# Altium footprint library Pcb-hionyPcbLib.PcbLib: 580 footprints (part 14 of 37)
Each footprint in its own frame and in the unit in brackets; x right, y up, seen from the top. Pads: shape width x height; smd on the part's side, far side on the other; paste and mask are expansions set on the pad; w line width, h text height; cw(c..) or ccw(c..) is an arc to the next point about the centre after c.
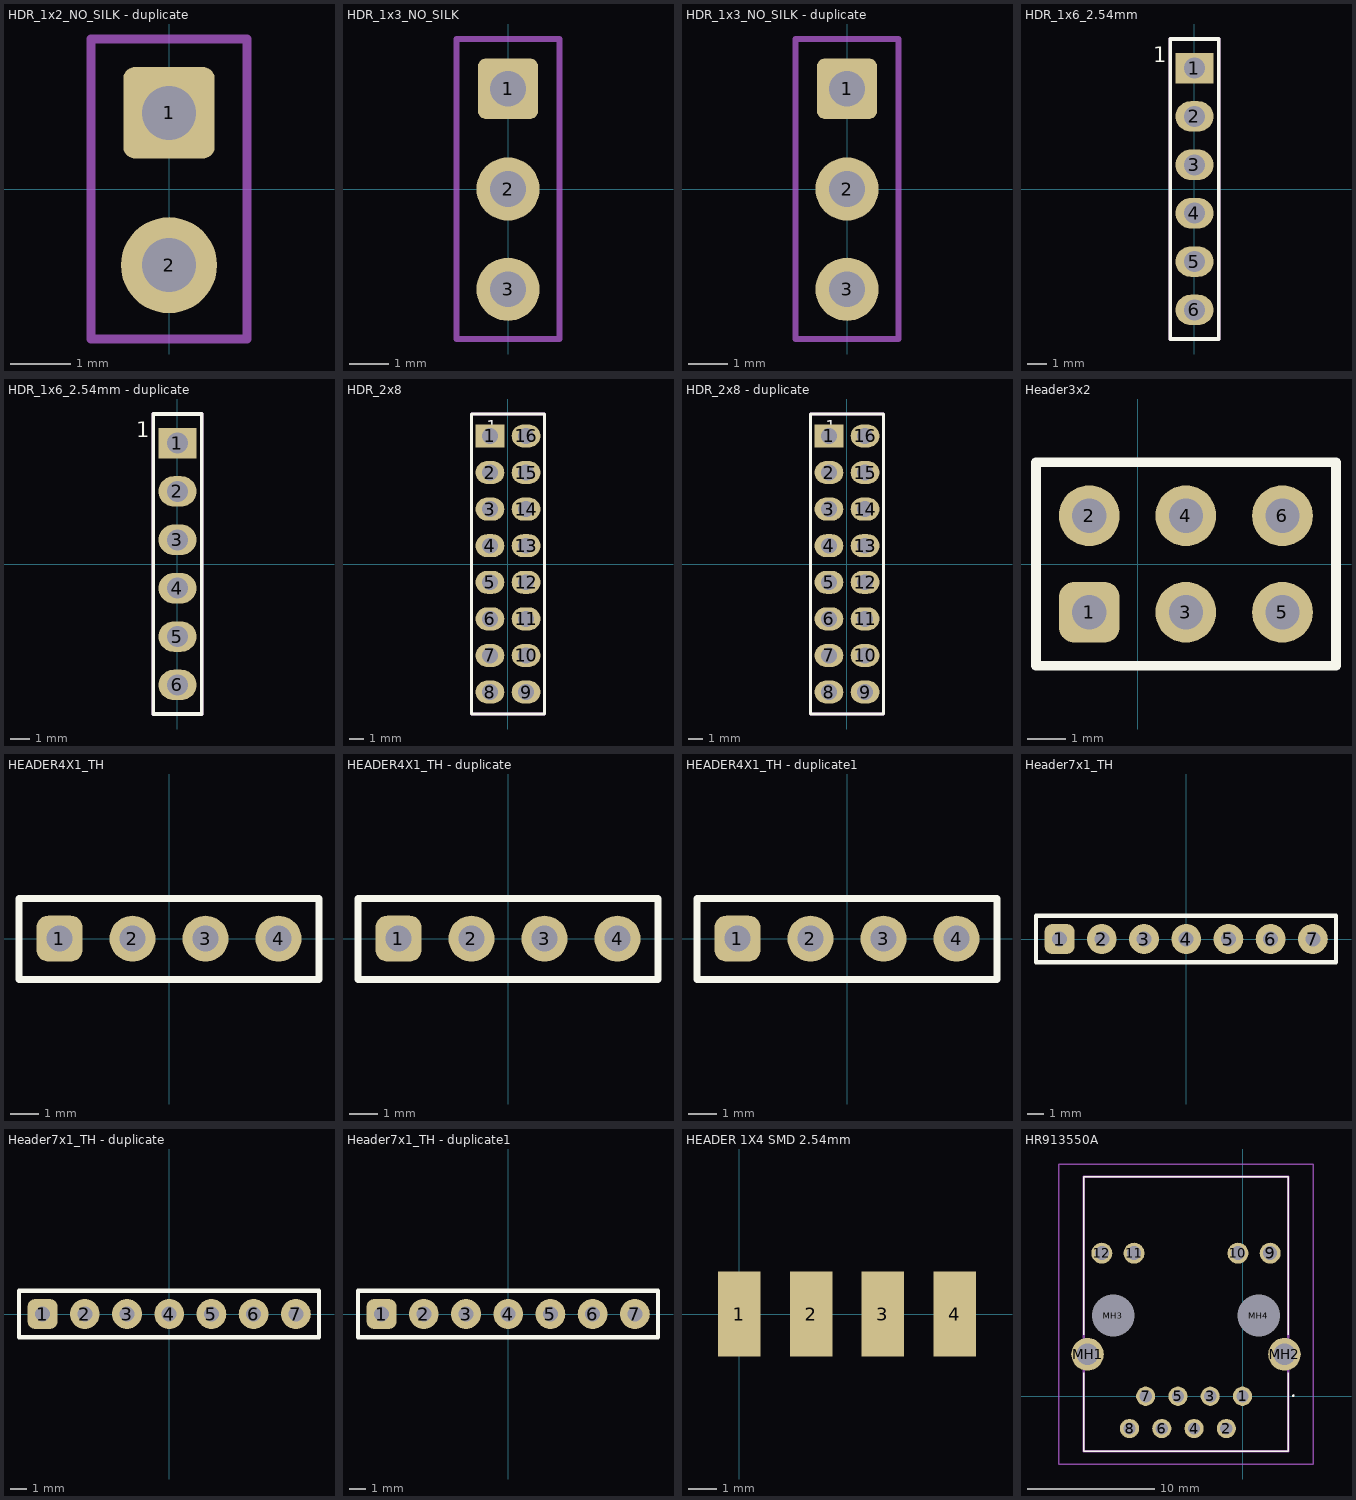
[diagram p13: the footprints below, top view; thin cyan lines are the x and y axes]

## HDR_1x2_NO_SILK - duplicate [mm]
pads (2):
  rrect25% 1.524x1.524 hole 0.9: 1(0,1.27)
  round 1.6 hole 0.9: 2(0,-1.27)
Mechanical 15:
  lines w0.15: -1.3,-2.5 1.3,-2.5 1.3,2.5 -1.3,2.5 -1.3,-2.5
  text ".Designator" at -0.286,0.829 h0.55
3D body "65775.stp": height 8.54, standoff -3, extent -1.27,-2.54 1.27,0
3D body "65775.stp": height 8.54, standoff -3, extent -1.27,0 1.27,2.54

## HDR_1x3_NO_SILK [mm]
pads (3):
  rrect25% 1.524x1.524 hole 0.9: 1(0,2.54)
  round 1.6 hole 0.9: 2(0,0) 3(0,-2.54)
Mechanical 15:
  lines w0.15: -1.3,-3.8 1.3,-3.8 1.3,3.8 -1.3,3.8 -1.3,-3.8
  text ".Designator" at 0.286,-1.549 h0.55
3D body "65775.stp": height 8.54, standoff -3, extent -1.27,1.27 1.27,3.81
3D body "65775.stp": height 8.54, standoff -3, extent -1.27,-1.27 1.27,1.27
3D body "65775.stp": height 8.54, standoff -3, extent -1.27,-3.81 1.27,-1.27

## HDR_1x3_NO_SILK - duplicate [mm]
pads (3):
  rrect25% 1.524x1.524 hole 0.9: 1(0,2.54)
  round 1.6 hole 0.9: 2(0,0) 3(0,-2.54)
Mechanical 15:
  lines w0.15: -1.3,-3.8 1.3,-3.8 1.3,3.8 -1.3,3.8 -1.3,-3.8
  text ".Designator" at 0.286,-1.549 h0.55
3D body "65775.stp": height 8.54, standoff -3, extent -1.27,1.27 1.27,3.81
3D body "65775.stp": height 8.54, standoff -3, extent -1.27,-1.27 1.27,1.27
3D body "65775.stp": height 8.54, standoff -3, extent -1.27,-3.81 1.27,-1.27

## HDR_1x6_2.54mm [mm]
pads (6):
  rect 2x1.6 hole 1.1: 1(0,6.35)
  oval 2x1.6 hole 1.1: 2(0,3.81) 3(0,1.27) 4(0,-1.27) 5(0,-3.81) 6(0,-6.35)
Top Overlay:
  lines w0.2: -1.27,-7.874 1.27,-7.874 1.27,7.874 -1.27,7.874 -1.27,-7.874
  text "1" at -2.159,6.655 h0.8
Mechanical 13:
  circle w0.5: c0,6.35 r0.254
  lines w0.2: -1.27,-7.874 -1.27,7.874 1.27,7.874 1.27,-7.874 -1.27,-7.874
  text ".Designator" at 0.762,-7.62 h1.52
3D body "Header1x2.STEP": height 8.45, standoff -2.53, extent -1.226,-7.584 1.314,-2.504
3D body "Header1x2.STEP": height 8.45, standoff -2.53, extent -1.226,-2.529 1.314,2.551
3D body "Header1x2.STEP": height 8.45, standoff -2.53, extent -1.226,2.551 1.314,7.631

## HDR_1x6_2.54mm - duplicate [mm]
pads (6):
  rect 2x1.6 hole 1.1: 1(0,6.35)
  oval 2x1.6 hole 1.1: 2(0,3.81) 3(0,1.27) 4(0,-1.27) 5(0,-3.81) 6(0,-6.35)
Top Overlay:
  lines w0.2: -1.27,-7.874 -1.27,7.874 1.27,7.874 1.27,-7.874 -1.27,-7.874
  text "1" at -2.159,6.655 h0.8
Mechanical 13:
  circle w0.5: c0,6.35 r0.254
  lines w0.2: -1.27,-7.874 1.27,-7.874 1.27,7.874 -1.27,7.874 -1.27,-7.874
  text ".Designator" at 0.762,-7.62 h1.52
3D body "Header1x2.STEP": height 8.45, standoff -2.53, extent -1.226,2.551 1.314,7.631
3D body "Header1x2.STEP": height 8.45, standoff -2.53, extent -1.226,-2.529 1.314,2.551
3D body "Header1x2.STEP": height 8.45, standoff -2.53, extent -1.226,-7.584 1.314,-2.504

## HDR_2x8 [mm]
pads (16):
  rect 2x1.6 hole 1.1: 1(-1.257,8.89)
  oval 2x1.6 hole 1.1: 2(-1.257,6.35) 3(-1.257,3.81) 4(-1.257,1.27) 5(-1.257,-1.27) 6(-1.257,-3.81) 7(-1.257,-6.35) 8(-1.257,-8.89) 9(1.257,-8.89) 10(1.257,-6.35) 11(1.257,-3.81) 12(1.257,-1.27) 13(1.257,1.27) 14(1.257,3.81) 15(1.257,6.35) 16(1.257,8.89)
Top Overlay:
  lines w0.2: -0.013,-10.414 2.527,-10.414 2.527,10.414 -0.013,10.414 ; 0.013,-10.414 -2.527,-10.414 -2.527,10.414 0.013,10.414
  text "1" at -1.461,9.169 h0.8
Mechanical 13:
  circle w0.5: c-1.257,8.89 r0.254
  lines w0.2: -0.013,-10.414 2.527,-10.414 2.527,10.414 -0.013,10.414 ; 0.013,-10.414 -2.527,-10.414 -2.527,10.414 0.013,10.414
  text ".Designator" at 1.511,-3.151 h1.52
3D body "m20-7820842_asm.stp": height 8.51, standoff -2.99, extent -2.507,-10.414 -0.007,10.306
3D body "m20-7820842_asm.stp": height 8.51, standoff -2.99, extent 0.007,-10.414 2.507,10.306

## HDR_2x8 - duplicate [mm]
pads (16):
  rect 2x1.6 hole 1.1: 1(-1.257,8.89)
  oval 2x1.6 hole 1.1: 2(-1.257,6.35) 3(-1.257,3.81) 4(-1.257,1.27) 5(-1.257,-1.27) 6(-1.257,-3.81) 7(-1.257,-6.35) 8(-1.257,-8.89) 9(1.257,-8.89) 10(1.257,-6.35) 11(1.257,-3.81) 12(1.257,-1.27) 13(1.257,1.27) 14(1.257,3.81) 15(1.257,6.35) 16(1.257,8.89)
Top Overlay:
  lines w0.2: -0.013,-10.414 2.527,-10.414 2.527,10.414 -0.013,10.414 ; 0.013,-10.414 -2.527,-10.414 -2.527,10.414 0.013,10.414
  text "1" at -1.461,9.169 h0.8
Mechanical 13:
  circle w0.5: c-1.257,8.89 r0.254
  lines w0.2: -0.013,-10.414 2.527,-10.414 2.527,10.414 -0.013,10.414 ; 0.013,-10.414 -2.527,-10.414 -2.527,10.414 0.013,10.414
  text ".Designator" at 1.511,-3.151 h1.52
3D body "m20-7820842_asm.stp": height 8.51, standoff -2.99, extent -2.507,-10.414 -0.007,10.306
3D body "m20-7820842_asm.stp": height 8.51, standoff -2.99, extent 0.007,-10.414 2.507,10.306

## Header3x2 [mm]
pads (6):
  rrect50% 1.6x1.6 hole 0.9: 1(-1.271,-1.271)
  round 1.6 hole 0.9: 2(-1.271,1.271) 3(1.271,-1.271) 4(1.271,1.271) 5(3.814,-1.271) 6(3.814,1.271)
Top Overlay:
  lines w0.254: -2.675,-2.675 -2.675,2.675 5.225,2.675 5.225,-2.675 -2.675,-2.675
Mechanical 15:
  lines w0.15: -2.675,-2.675 5.225,-2.675 5.225,2.675 -2.675,2.675 -2.675,-2.675
  text ".Designator" at 1.925,0.2 h0.55
3D body "65775.stp": height 8.54, standoff -3, extent -2.541,0.002 -0.001,2.542
3D body "65775.stp": height 8.54, standoff -3, extent 0.001,0.002 2.541,2.542
3D body "65775.stp": height 8.54, standoff -3, extent 2.544,0.002 5.084,2.542
3D body "65775.stp": height 8.54, standoff -3, extent 2.544,-2.541 5.084,-0.001
3D body "65775.stp": height 8.54, standoff -3, extent 0.001,-2.541 2.541,-0.001
3D body "65775.stp": height 8.54, standoff -3, extent -2.541,-2.541 -0.001,-0.001

## HEADER4X1_TH [mm]
pads (4):
  rrect50% 1.6x1.6 hole 0.9: 1(-3.814,0)
  round 1.6 hole 0.9: 2(-1.271,0) 3(1.271,0) 4(3.814,0)
Top Overlay:
  lines w0.254: -5.225,-1.425 -5.225,1.4 5.225,1.4 5.225,-1.425 -5.225,-1.425
Mechanical 15:
  lines w0.15: -5.225,-1.425 5.225,-1.425 5.225,1.4 -5.225,1.4 -5.225,-1.425
  text ".Designator" at 0.291,-0.875 h0.55
3D body "65775.stp": height 8.54, standoff -3, extent -5.084,-1.27 -2.544,1.27
3D body "65775.stp": height 8.54, standoff -3, extent -2.541,-1.27 -0.001,1.27
3D body "65775.stp": height 8.54, standoff -3, extent 0.001,-1.27 2.541,1.27
3D body "65775.stp": height 8.54, standoff -3, extent 2.544,-1.27 5.084,1.27

## HEADER4X1_TH - duplicate [mm]
pads (4):
  rrect50% 1.6x1.6 hole 0.9: 1(-3.814,0)
  round 1.6 hole 0.9: 2(-1.271,0) 3(1.271,0) 4(3.814,0)
Top Overlay:
  lines w0.254: -5.225,-1.425 5.225,-1.425 5.225,1.4 -5.225,1.4 -5.225,-1.425
Mechanical 15:
  lines w0.15: -5.225,-1.425 -5.225,1.4 5.225,1.4 5.225,-1.425 -5.225,-1.425
  text ".Designator" at 0.175,-0.85 h0.55
3D body "65775.stp": height 8.54, standoff -3, extent 2.544,-1.27 5.084,1.27
3D body "65775.stp": height 8.54, standoff -3, extent 0.001,-1.27 2.541,1.27
3D body "65775.stp": height 8.54, standoff -3, extent -2.541,-1.27 -0.001,1.27
3D body "65775.stp": height 8.54, standoff -3, extent -5.084,-1.27 -2.544,1.27

## HEADER4X1_TH - duplicate1 [mm]
pads (4):
  rrect50% 1.6x1.6 hole 0.9: 1(-3.814,0)
  round 1.6 hole 0.9: 2(-1.271,0) 3(1.271,0) 4(3.814,0)
Top Overlay:
  lines w0.254: -5.225,-1.425 5.225,-1.425 5.225,1.4 -5.225,1.4 -5.225,-1.425
Mechanical 15:
  lines w0.15: -5.225,-1.425 -5.225,1.4 5.225,1.4 5.225,-1.425 -5.225,-1.425
  text ".Designator" at 0.175,-0.85 h0.55
3D body "65775.stp": height 8.54, standoff -3, extent 2.544,-1.27 5.084,1.27
3D body "65775.stp": height 8.54, standoff -3, extent 0.001,-1.27 2.541,1.27
3D body "65775.stp": height 8.54, standoff -3, extent -2.541,-1.27 -0.001,1.27
3D body "65775.stp": height 8.54, standoff -3, extent -5.084,-1.27 -2.544,1.27

## Header7x1_TH [mm]
pads (7):
  rrect50% 1.8x1.8 hole 0.9: 1(-7.629,0)
  round 1.8 hole 0.9: 2(-5.086,0) 3(-2.543,0) 4(0,0) 5(2.543,0) 6(5.086,0) 7(7.629,0)
Top Overlay:
  lines w0.254: -9.05,-1.4 9.025,-1.4 9.025,1.4 -9.05,1.4 -9.05,-1.4
Mechanical 15:
  lines w0.15: -9.05,-1.4 -9.05,1.4 9.025,1.4 9.025,-1.4 -9.05,-1.4
  text ".Designator" at 0.475,-0.625 h0.55
3D body "65775.stp": height 8.54, standoff -3, extent -8.899,-1.27 -6.359,1.27
3D body "65775.stp": height 8.54, standoff -3, extent -6.356,-1.27 -3.816,1.27
3D body "65775.stp": height 8.54, standoff -3, extent -3.813,-1.27 -1.273,1.27
3D body "65775.stp": height 8.54, standoff -3, extent -1.27,-1.27 1.27,1.27
3D body "65775.stp": height 8.54, standoff -3, extent 1.273,-1.27 3.813,1.27
3D body "65775.stp": height 8.54, standoff -3, extent 3.816,-1.27 6.356,1.27
3D body "65775.stp": height 8.54, standoff -3, extent 6.359,-1.27 8.899,1.27

## Header7x1_TH - duplicate [mm]
pads (7):
  rrect50% 1.8x1.8 hole 0.9: 1(-7.629,0)
  round 1.8 hole 0.9: 2(-5.086,0) 3(-2.543,0) 4(0,0) 5(2.543,0) 6(5.086,0) 7(7.629,0)
Top Overlay:
  lines w0.254: -9.05,-1.4 9.025,-1.4 9.025,1.4 -9.05,1.4 -9.05,-1.4
Mechanical 15:
  lines w0.15: -9.05,-1.4 -9.05,1.4 9.025,1.4 9.025,-1.4 -9.05,-1.4
  text ".Designator" at 0.475,-0.625 h0.55
3D body "65775.stp": height 8.54, standoff -3, extent -8.899,-1.27 -6.359,1.27
3D body "65775.stp": height 8.54, standoff -3, extent -6.356,-1.27 -3.816,1.27
3D body "65775.stp": height 8.54, standoff -3, extent -3.813,-1.27 -1.273,1.27
3D body "65775.stp": height 8.54, standoff -3, extent -1.27,-1.27 1.27,1.27
3D body "65775.stp": height 8.54, standoff -3, extent 1.273,-1.27 3.813,1.27
3D body "65775.stp": height 8.54, standoff -3, extent 3.816,-1.27 6.356,1.27
3D body "65775.stp": height 8.54, standoff -3, extent 6.359,-1.27 8.899,1.27

## Header7x1_TH - duplicate1 [mm]
pads (7):
  rrect50% 1.8x1.8 hole 0.9: 1(-7.629,0)
  round 1.8 hole 0.9: 2(-5.086,0) 3(-2.543,0) 4(0,0) 5(2.543,0) 6(5.086,0) 7(7.629,0)
Top Overlay:
  lines w0.254: -9.05,-1.4 9.025,-1.4 9.025,1.4 -9.05,1.4 -9.05,-1.4
Mechanical 15:
  lines w0.15: -9.05,-1.4 -9.05,1.4 9.025,1.4 9.025,-1.4 -9.05,-1.4
  text ".Designator" at 0.475,-0.625 h0.55
3D body "65775.stp": height 8.54, standoff -3, extent -8.899,-1.27 -6.359,1.27
3D body "65775.stp": height 8.54, standoff -3, extent -6.356,-1.27 -3.816,1.27
3D body "65775.stp": height 8.54, standoff -3, extent -3.813,-1.27 -1.273,1.27
3D body "65775.stp": height 8.54, standoff -3, extent -1.27,-1.27 1.27,1.27
3D body "65775.stp": height 8.54, standoff -3, extent 1.273,-1.27 3.813,1.27
3D body "65775.stp": height 8.54, standoff -3, extent 3.816,-1.27 6.356,1.27
3D body "65775.stp": height 8.54, standoff -3, extent 6.359,-1.27 8.899,1.27

## HEADER 1X4 SMD 2.54mm [mm]
pads (4):
  rect 1.5x3 smd: 1(0,0) 2(2.54,0) 3(5.08,0) 4(7.62,0)

## HR913550A [mm]
pads (16):
  round 1.509 hole 0.97: 1(0,0) 2(-1.27,-2.54) 3(-2.54,0) 4(-3.81,-2.54) 5(-5.08,0) 6(-6.35,-2.54) 7(-7.62,0) 8(-8.89,-2.54)
  round 1.65 hole 1.1: 9(2.18,11.25) 10(-0.36,11.25) 11(-8.53,11.25) 12(-11.07,11.25)
  round 2.565 hole 1.71: MH1(-12.19,3.3) MH2(3.3,3.3)
  round 1.665 hole 3.33 unplated: MH3(-10.16,6.35) MH4(1.27,6.35)
Top Overlay:
  lines w0.1: -12.495,1.85 -12.495,-4.33 3.605,-4.33 3.605,1.85 ; -12.495,4.85 -12.495,17.27 3.605,17.27 3.605,4.85 ; 4,0 cw(c4,0.05) 4,0.1 cw(c4,0.05) 4,0
Mechanical 13:
  lines w0.2: -12.495,-4.33 -12.495,17.27 3.605,17.27 3.605,-4.33 -12.495,-4.33
Mechanical 15:
  lines w0.1: -14.473,-5.33 -14.473,18.27 5.582,18.27 5.582,-5.33 -14.473,-5.33
3D body "HR913550A.stp": height 13.85, standoff -5, extent -12.945,-4.33 4.055,17.27